# Altium schematic symbol library LATTICEPLDS_Library.SchLib: 291 symbols (part 17 of 32) (continued)
## LFE5G-25F-BG381 (continued)
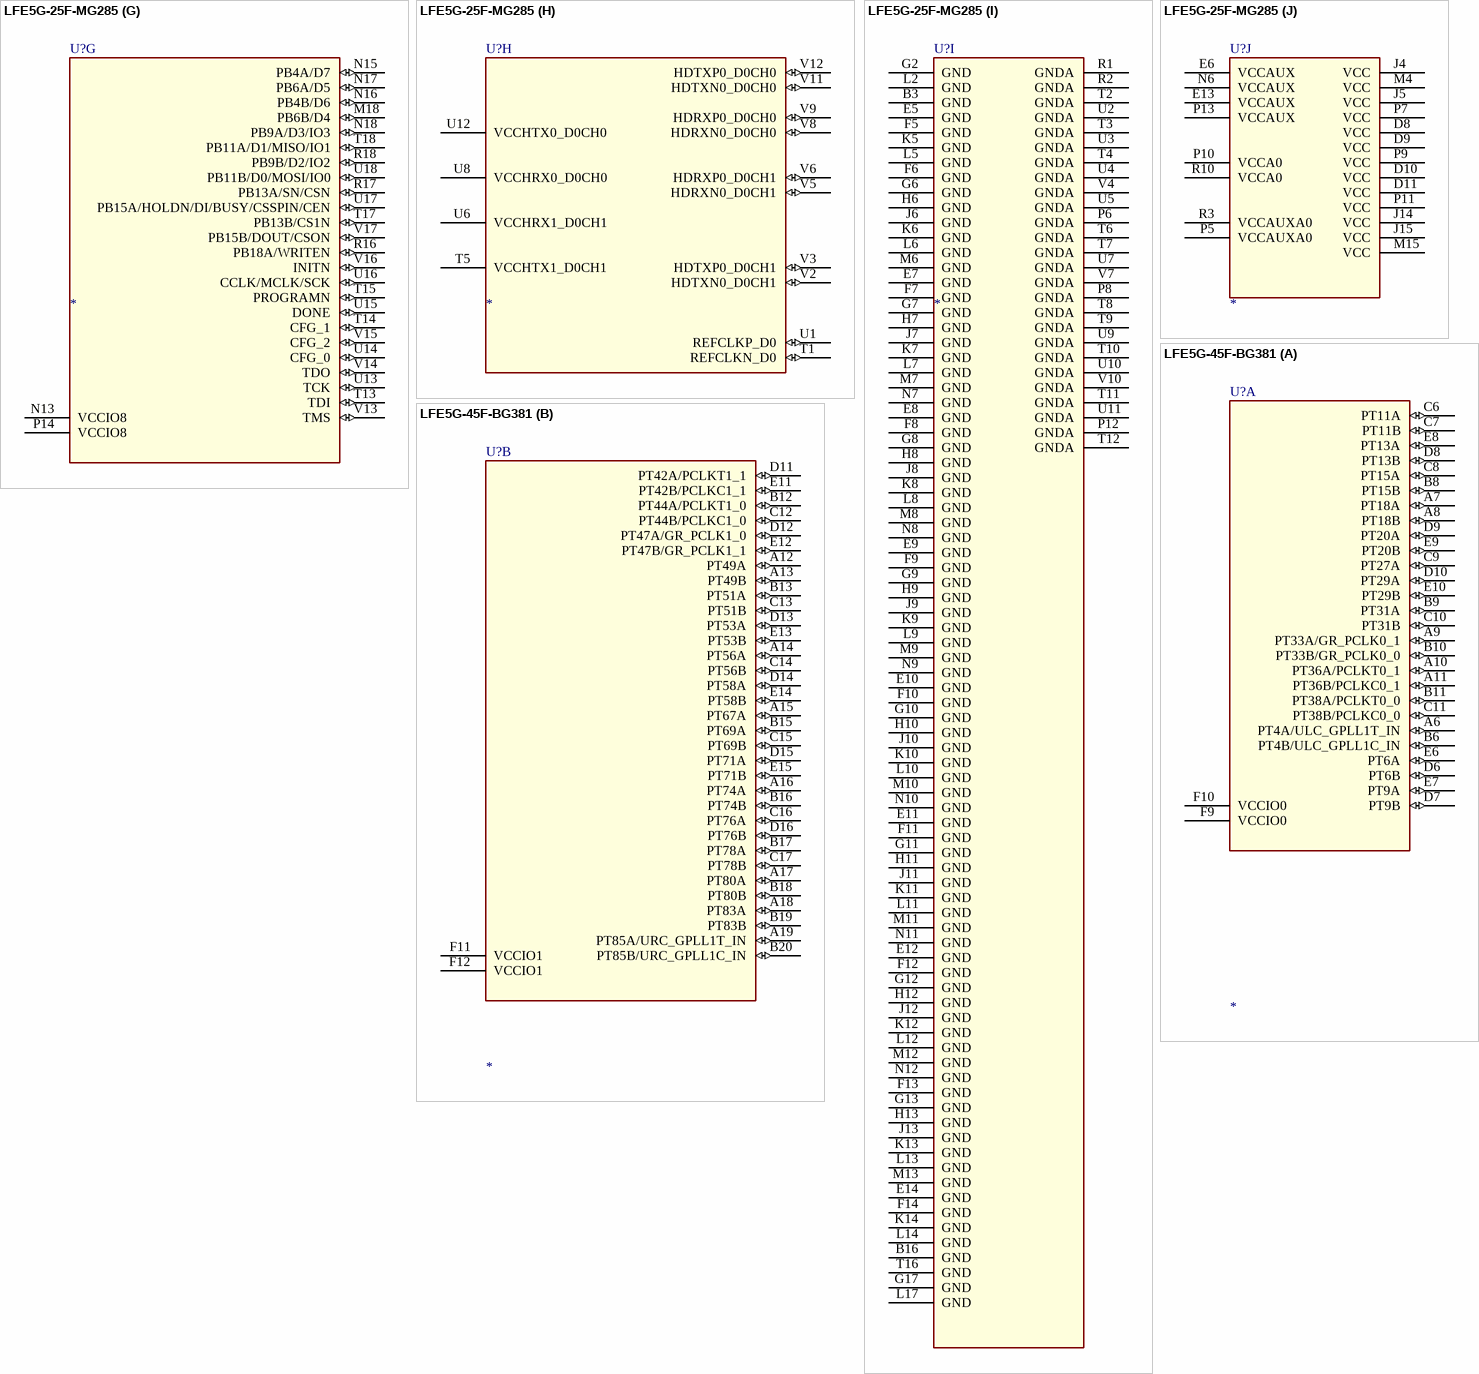
[diagram p158: symbols LFE5G-25F-MG285 to LFE5G-45F-BG381]

## LFE5G-25F-MG285
designator U?
SPLIT_INST: TRUE; SWAP_INFO: (S1+S2+S3+S4+S5+S6+S7+S8+S9+S10)
part A pins: A10 PT27B/PCLKC0_1 (io), A11 PT27A/PCLKT0_1 (io), B10 PT29A/PCLKT0_0 (io), B11 PT4A (io), C10 PT29B/PCLKC0_0 (io), C11 PT4B (io), D12 VCCIO0 (power)
part B pins: A8 PT35B/PCLKC1_0 (io), A9 PT35A/PCLKT1_0 (io), B8 PT67A (io), B9 PT33A/PCLKT1_1 (io), C8 PT67B (io), C9 PT33B/PCLKC1_1 (io), D7 VCCIO1 (power)
part C pins: A2 PR20C (io), A3 PR20A (io), A4 PR11B (io), A6 PR11A (io), A7 PR8B (io), B1 PR23B/PCLKC2_1 (io), B2 PR20B (io), B4 PR14C/VREF1_2 (io), B6 PR8A (io), B7 PR2B (io), C1 PR23C/PCLKT2_0 (io), C2 PR17B (io), C3 PR14D (io), C4 PR14B (io), C6 PR5B (io), C7 PR2A (io), D1 PR23D/PCLKC2_0 (io), D2 PR23A/PCLKT2_1 (io), D3 PR17A (io), D4 PR14A (io), D6 PR5A (io), G5 VCCIO2 (power), H5 VCCIO2 (power)
part D pins:  F15 PR26C/PCLKT3_0 (io),  F16 PR26D/PCLKC3_0 (io),  F17 PR32A (io),  F18 PR35C (io),  G15 PR26B/PCLKC3_1 (io),  G16 PR29B (io),  G18 PR32B (io),  H15 PR26A/PCLKT3_1 (io),  H16 PR29A (io),  H17 PR29D (io),  H18 PR35D (io),  J16 PR29C (io),  J17 PR35A (io),  J18 PR35B/VREF1_3 (io),  K15 PR38A (io),  K16 PR41C (io),  K17 PR44A (io),  K18 PR41D (io),  L15 PR38B (io),  L16 PR41B (io),  L18 PR44B (io),  M16 PR41A (io),  M17 PR44C (io),  M18 PR47C/LRC_GPLL0T_IN (io),  N15 PR38C (io),  N16 PR38D (io),  N17 PR44D (io),  N18 PR47D/LRC_GPLL0C_IN (io), M14 VCCIO3 (power), N14 VCCIO3 (power)
part E pins: C18 PL26B/PCLKC6_1 (io), D17 PL26A/PCLKT6_1 (io), D18 PL26C/PCLKT6_0 (io), F15 PL29C (io), F16 PL29B (io), F17 PL29A (io), F18 PL26D/PCLKC6_0 (io), G15 PL35A (io), G16 PL29D (io), G18 PL32A (io), H15 PL35B/VREF1_6 (io), H16 PL35C (io), H17 PL32B (io), H18 PL38D (io), J16 PL35D (io), J17 PL38C (io), J18 PL41A (io), K15 PL41D (io), K16 PL41C (io), K17 PL44A (io), K18 PL41B (io), L15 PL44C (io), L16 PL44D (io), L18 PL44B (io), M14 VCCIO6 (power), M16 PL47C/LLC_GPLL0T_IN (io), M17 PL47D/LLC_GPLL0C_IN (io), N14 VCCIO6 (power)
part F pins: A12 PL5A (io), A13 PL14B (io), A15 PL14D (io), A16 PL20B (io), A17 PL23A/PCLKT7_1 (io), B12 PL2B (io), B13 PL14A (io), B15 PL20A (io), B17 PL23B/PCLKC7_1 (io), B18 PL23C/PCLKT7_0 (io), C12 PL2A (io), C13 PL8B (io), C15 PL14C/VREF1_7 (io), C16 PL20C (io), C17 PL23D/PCLKC7_0 (io), D13 PL8A (io), D15 PL17A (io), D16 PL17B (io), G14 VCCIO7 (power), H14 VCCIO7 (power)
part G pins: M18 PB6B/D4 (io), N13 VCCIO8 (power), N15 PB4A/D7 (io), N16 PB4B/D6 (io), N17 PB6A/D5 (io), N18 PB9A/D3/IO3 (io), P14 VCCIO8 (power), R16 PB18A/WRITEN (io), R17 PB13A/SN/CSN (io), R18 PB9B/D2/IO2 (io), T13 TDI (io), T14 CFG_1 (io), T15 PROGRAMN (io), T17 PB13B/CS1N (io), T18 PB11A/D1/MISO/IO1 (io), U13 TCK (io), U14 CFG_0 (io), U15 DONE (io), U16 CCLK/MCLK/SCK (io), U17 PB15A/HOLDN/DI/BUSY/CSSPIN/CEN (io), U18 PB11B/D0/MOSI/IO0 (io), V13 TMS (io), V14 TDO (io), V15 CFG_2 (io), V16 INITN (io), V17 PB15B/DOUT/CSON (io)
part H pins: T1 REFCLKN_D0 (io), T5 VCCHTX1_D0CH1 (power), U1 REFCLKP_D0 (io), U6 VCCHRX1_D0CH1 (power), U8 VCCHRX0_D0CH0 (power), U12 VCCHTX0_D0CH0 (power), V2 HDTXN0_D0CH1 (io), V3 HDTXP0_D0CH1 (io), V5 HDRXN0_D0CH1 (io), V6 HDRXP0_D0CH1 (io), V8 HDRXN0_D0CH0 (io), V9 HDRXP0_D0CH0 (io), V11 HDTXN0_D0CH0 (io), V12 HDTXP0_D0CH0 (io)
part I pins: B3 GND (power), B16 GND (power), E5 GND (power), E7 GND (power), E8 GND (power), E9 GND (power), E10 GND (power), E11 GND (power), E12 GND (power), E14 GND (power), F5 GND (power), F6 GND (power), F7 GND (power), F8 GND (power), F9 GND (power), F10 GND (power), F11 GND (power), F12 GND (power), F13 GND (power), F14 GND (power), G2 GND (power), G6 GND (power), G7 GND (power), G8 GND (power), G9 GND (power), G10 GND (power), G11 GND (power), G12 GND (power), G13 GND (power), G17 GND (power), H6 GND (power), H7 GND (power), H8 GND (power), H9 GND (power), H10 GND (power), H11 GND (power), H12 GND (power), H13 GND (power), J6 GND (power), J7 GND (power), J8 GND (power), J9 GND (power), J10 GND (power), J11 GND (power), J12 GND (power), J13 GND (power), K5 GND (power), K6 GND (power), K7 GND (power), K8 GND (power), K9 GND (power), K10 GND (power), K11 GND (power), K12 GND (power), K13 GND (power), K14 GND (power), L2 GND (power), L5 GND (power), L6 GND (power), L7 GND (power), L8 GND (power), L9 GND (power), L10 GND (power), L11 GND (power), L12 GND (power), L13 GND (power), L14 GND (power), L17 GND (power), M6 GND (power), M7 GND (power), M8 GND (power), M9 GND (power), M10 GND (power), M11 GND (power), M12 GND (power), M13 GND (power), N7 GND (power), N8 GND (power), N9 GND (power), N10 GND (power), N11 GND (power), N12 GND (power), P6 GNDA (power), P8 GNDA (power), P12 GNDA (power), R1 GNDA (power), R2 GNDA (power), T2 GNDA (power), T3 GNDA (power), T4 GNDA (power), T6 GNDA (power), T7 GNDA (power), T8 GNDA (power), T9 GNDA (power), T10 GNDA (power), T11 GNDA (power), T12 GNDA (power), T16 GND (power), U2 GNDA (power), U3 GNDA (power), U4 GNDA (power), U5 GNDA (power), U7 GNDA (power), U9 GNDA (power), U10 GNDA (power), U11 GNDA (power), V4 GNDA (power), V7 GNDA (power), V10 GNDA (power)
part J pins: D8 VCC (power), D9 VCC (power), D10 VCC (power), D11 VCC (power), E6 VCCAUX (power), E13 VCCAUX (power), J4 VCC (power), J5 VCC (power), J14 VCC (power), J15 VCC (power), M4 VCC (power), M15 VCC (power), N6 VCCAUX (power), P5 VCCAUXA0 (power), P7 VCC (power), P9 VCC (power), P10 VCCA0 (power), P11 VCC (power), P13 VCCAUX (power), R3 VCCAUXA0 (power), R10 VCCA0 (power)

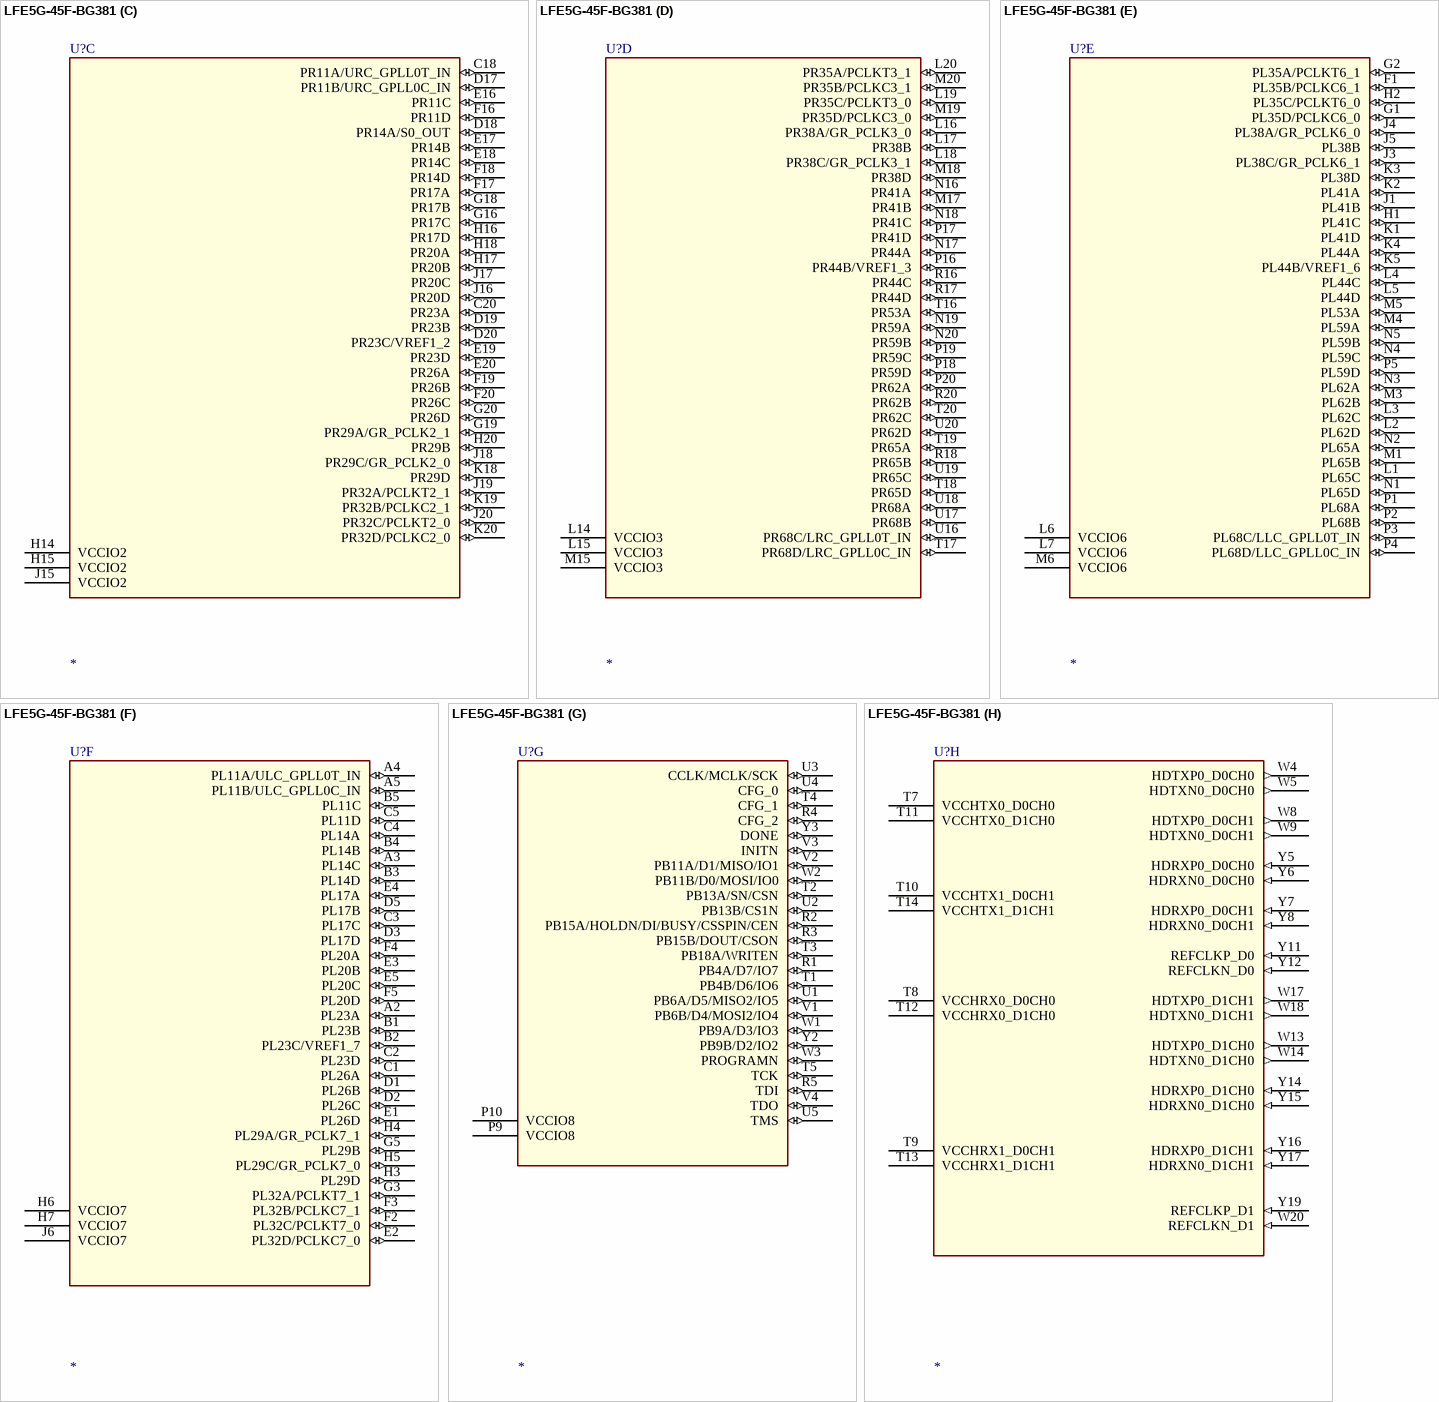
[diagram p159: symbol LFE5G-45F-BG381]

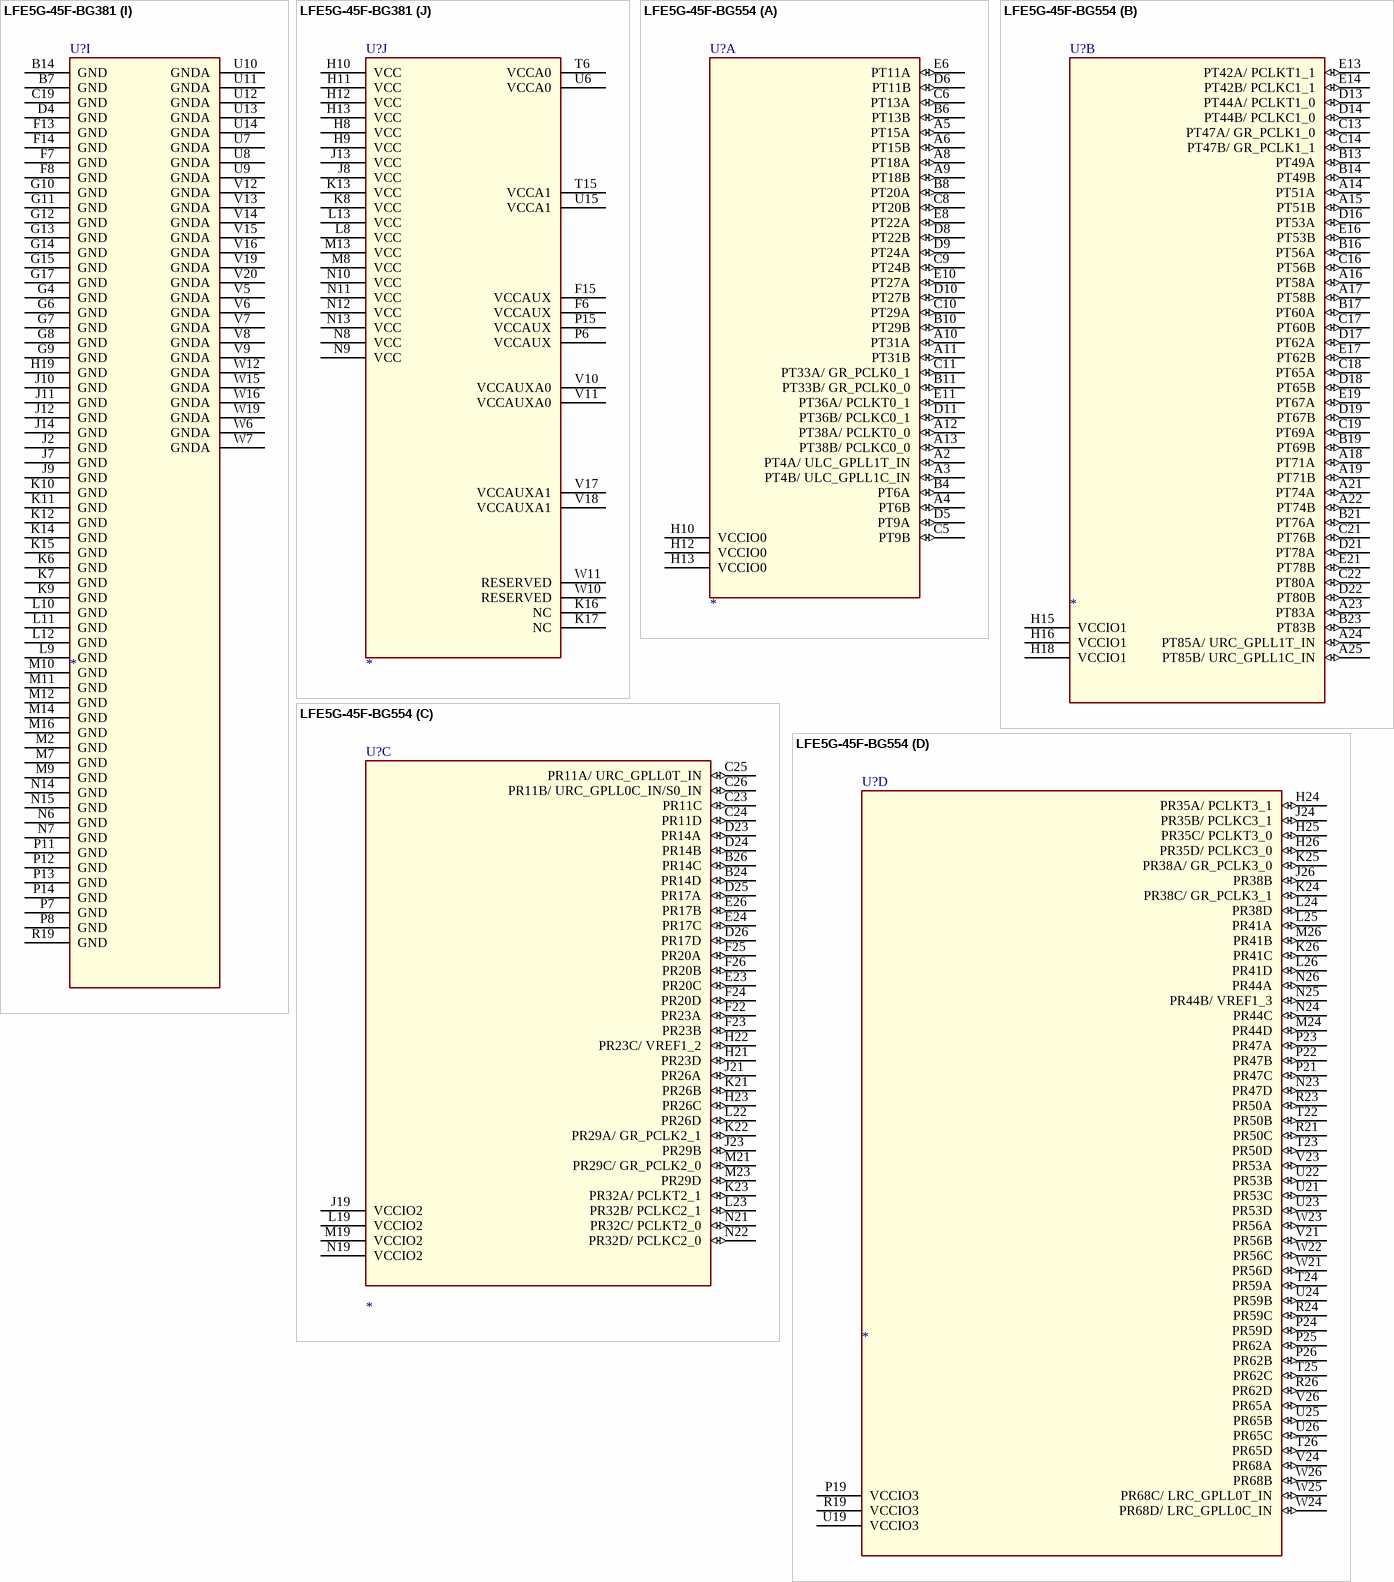
[diagram p160: symbols LFE5G-45F-BG381 to LFE5G-45F-BG554]

## LFE5G-45F-BG381
designator U?
SWAP_INFO: (S1+S2+S3+S4+S5+S6+S7+S8+S9+S10); SPLIT_INST: TRUE
part A pins: A6 PT4A/ULC_GPLL1T_IN (io), A7 PT18A (io), A8 PT18B (io), A9 PT33A/GR_PCLK0_1 (io), A10 PT36A/PCLKT0_1 (io), A11 PT36B/PCLKC0_1 (io), B6 PT4B/ULC_GPLL1C_IN (io), B8 PT15B (io), B9 PT31A (io), B10 PT33B/GR_PCLK0_0 (io), B11 PT38A/PCLKT0_0 (io), C6 PT11A (io), C7 PT11B (io), C8 PT15A (io), C9 PT27A (io), C10 PT31B (io), C11 PT38B/PCLKC0_0 (io), D6 PT6B (io), D7 PT9B (io), D8 PT13B (io), D9 PT20A (io), D10 PT29A (io), E6 PT6A (io), E7 PT9A (io), E8 PT13A (io), E9 PT20B (io), E10 PT29B (io), F9 VCCIO0 (power), F10 VCCIO0 (power)
part B pins: A12 PT49A (io), A13 PT49B (io), A14 PT56A (io), A15 PT67A (io), A16 PT74A (io), A17 PT80A (io), A18 PT83A (io), A19 PT85A/URC_GPLL1T_IN (io), B12 PT44A/PCLKT1_0 (io), B13 PT51A (io), B15 PT69A (io), B16 PT74B (io), B17 PT78A (io), B18 PT80B (io), B19 PT83B (io), B20 PT85B/URC_GPLL1C_IN (io), C12 PT44B/PCLKC1_0 (io), C13 PT51B (io), C14 PT56B (io), C15 PT69B (io), C16 PT76A (io), C17 PT78B (io), D11 PT42A/PCLKT1_1 (io), D12 PT47A/GR_PCLK1_0 (io), D13 PT53A (io), D14 PT58A (io), D15 PT71A (io), D16 PT76B (io), E11 PT42B/PCLKC1_1 (io), E12 PT47B/GR_PCLK1_1 (io), E13 PT53B (io), E14 PT58B (io), E15 PT71B (io), F11 VCCIO1 (power), F12 VCCIO1 (power)
part C pins: C18 PR11A/URC_GPLL0T_IN (io), C20 PR23A (io), D17 PR11B/URC_GPLL0C_IN (io), D18 PR14A/S0_OUT (io), D19 PR23B (io), D20 PR23C/VREF1_2 (io), E16 PR11C (io), E17 PR14B (io), E18 PR14C (io), E19 PR23D (io), E20 PR26A (io), F16 PR11D (io), F17 PR17A (io), F18 PR14D (io), F19 PR26B (io), F20 PR26C (io), G16 PR17C (io), G18 PR17B (io), G19 PR29A/GR_PCLK2_1 (io), G20 PR26D (io), H14 VCCIO2 (power), H15 VCCIO2 (power), H16 PR17D (io), H17 PR20B (io), H18 PR20A (io), H20 PR29B (io), J15 VCCIO2 (power), J16 PR20D (io), J17 PR20C (io), J18 PR29C/GR_PCLK2_0 (io), J19 PR32A/PCLKT2_1 (io), J20 PR32C/PCLKT2_0 (io), K18 PR29D (io), K19 PR32B/PCLKC2_1 (io), K20 PR32D/PCLKC2_0 (io)
part D pins: L14 VCCIO3 (power), L15 VCCIO3 (power), L16 PR38A/GR_PCLK3_0 (io), L17 PR38B (io), L18 PR38C/GR_PCLK3_1 (io), L19 PR35C/PCLKT3_0 (io), L20 PR35A/PCLKT3_1 (io), M15 VCCIO3 (power), M17 PR41B (io), M18 PR38D (io), M19 PR35D/PCLKC3_0 (io), M20 PR35B/PCLKC3_1 (io), N16 PR41A (io), N17 PR44A (io), N18 PR41C (io), N19 PR59A (io), N20 PR59B (io), P16 PR44B/VREF1_3 (io), P17 PR41D (io), P18 PR59D (io), P19 PR59C (io), P20 PR62A (io), R16 PR44C (io), R17 PR44D (io), R18 PR65B (io), R20 PR62B (io), T16 PR53A (io), T17 PR68D/LRC_GPLL0C_IN (io), T18 PR65D (io), T19 PR65A (io), T20 PR62C (io), U16 PR68C/LRC_GPLL0T_IN (io), U17 PR68B (io), U18 PR68A (io), U19 PR65C (io), U20 PR62D (io)
part E pins: F1 PL35B/PCLKC6_1 (io), G1 PL35D/PCLKC6_0 (io), G2 PL35A/PCLKT6_1 (io), H1 PL41C (io), H2 PL35C/PCLKT6_0 (io), J1 PL41B (io), J3 PL38C/GR_PCLK6_1 (io), J4 PL38A/GR_PCLK6_0 (io), J5 PL38B (io), K1 PL41D (io), K2 PL41A (io), K3 PL38D (io), K4 PL44A (io), K5 PL44B/VREF1_6 (io), L1 PL65C (io), L2 PL62D (io), L3 PL62C (io), L4 PL44C (io), L5 PL44D (io), L6 VCCIO6 (power), L7 VCCIO6 (power), M1 PL65B (io), M3 PL62B (io), M4 PL59A (io), M5 PL53A (io), M6 VCCIO6 (power), N1 PL65D (io), N2 PL65A (io), N3 PL62A (io), N4 PL59C (io), N5 PL59B (io), P1 PL68A (io), P2 PL68B (io), P3 PL68C/LLC_GPLL0T_IN (io), P4 PL68D/LLC_GPLL0C_IN (io), P5 PL59D (io)
part F pins: A2 PL23A (io), A3 PL14C (io), A4 PL11A/ULC_GPLL0T_IN (io), A5 PL11B/ULC_GPLL0C_IN (io), B1 PL23B (io), B2 PL23C/VREF1_7 (io), B3 PL14D (io), B4 PL14B (io), B5 PL11C (io), C1 PL26A (io), C2 PL23D (io), C3 PL17C (io), C4 PL14A (io), C5 PL11D (io), D1 PL26B (io), D2 PL26C (io), D3 PL17D (io), D5 PL17B (io), E1 PL26D (io), E2 PL32D/PCLKC7_0 (io), E3 PL20B (io), E4 PL17A (io), E5 PL20C (io), F2 PL32C/PCLKT7_0 (io), F3 PL32B/PCLKC7_1 (io), F4 PL20A (io), F5 PL20D (io), G3 PL32A/PCLKT7_1 (io), G5 PL29B (io), H3 PL29D (io), H4 PL29A/GR_PCLK7_1 (io), H5 PL29C/GR_PCLK7_0 (io), H6 VCCIO7 (power), H7 VCCIO7 (power), J6 VCCIO7 (power)
part G pins: P9 VCCIO8 (power), P10 VCCIO8 (power), R1 PB4A/D7/IO7 (io), R2 PB15A/HOLDN/DI/BUSY/CSSPIN/CEN (io), R3 PB15B/DOUT/CSON (io), R4 CFG_2 (io), R5 TDI (io), T1 PB4B/D6/IO6 (io), T2 PB13A/SN/CSN (io), T3 PB18A/WRITEN (io), T4 CFG_1 (io), T5 TCK (io), U1 PB6A/D5/MISO2/IO5 (io), U2 PB13B/CS1N (io), U3 CCLK/MCLK/SCK (io), U4 CFG_0 (io), U5 TMS (io), V1 PB6B/D4/MOSI2/IO4 (io), V2 PB11A/D1/MISO/IO1 (io), V3 INITN (io), V4 TDO (io), W1 PB9A/D3/IO3 (io), W2 PB11B/D0/MOSI/IO0 (io), W3 PROGRAMN (io), Y2 PB9B/D2/IO2 (io), Y3 DONE (io)
part H pins: T7 VCCHTX0_D0CH0 (power), T8 VCCHRX0_D0CH0 (power), T9 VCCHRX1_D0CH1 (power), T10 VCCHTX1_D0CH1 (power), T11 VCCHTX0_D1CH0 (power), T12 VCCHRX0_D1CH0 (power), T13 VCCHRX1_D1CH1 (power), T14 VCCHTX1_D1CH1 (power), W4 HDTXP0_D0CH0 (out), W5 HDTXN0_D0CH0 (out), W8 HDTXP0_D0CH1 (out), W9 HDTXN0_D0CH1 (out), W13 HDTXP0_D1CH0 (out), W14 HDTXN0_D1CH0 (out), W17 HDTXP0_D1CH1 (out), W18 HDTXN0_D1CH1 (out), W20 REFCLKN_D1 (in), Y5 HDRXP0_D0CH0 (in), Y6 HDRXN0_D0CH0 (in), Y7 HDRXP0_D0CH1 (in), Y8 HDRXN0_D0CH1 (in), Y11 REFCLKP_D0 (in), Y12 REFCLKN_D0 (in), Y14 HDRXP0_D1CH0 (in), Y15 HDRXN0_D1CH0 (in), Y16 HDRXP0_D1CH1 (in), Y17 HDRXN0_D1CH1 (in), Y19 REFCLKP_D1 (in)
part I pins: B7 GND (power), B14 GND (power), C19 GND (power), D4 GND (power), F7 GND (power), F8 GND (power), F13 GND (power), F14 GND (power), G4 GND (power), G6 GND (power), G7 GND (power), G8 GND (power), G9 GND (power), G10 GND (power), G11 GND (power), G12 GND (power), G13 GND (power), G14 GND (power), G15 GND (power), G17 GND (power), H19 GND (power), J2 GND (power), J7 GND (power), J9 GND (power), J10 GND (power), J11 GND (power), J12 GND (power), J14 GND (power), K6 GND (power), K7 GND (power), K9 GND (power), K10 GND (power), K11 GND (power), K12 GND (power), K14 GND (power), K15 GND (power), L9 GND (power), L10 GND (power), L11 GND (power), L12 GND (power), M2 GND (power), M7 GND (power), M9 GND (power), M10 GND (power), M11 GND (power), M12 GND (power), M14 GND (power), M16 GND (power), N6 GND (power), N7 GND (power), N14 GND (power), N15 GND (power), P7 GND (power), P8 GND (power), P11 GND (power), P12 GND (power), P13 GND (power), P14 GND (power), R19 GND (power), U7 GNDA (power), U8 GNDA (power), U9 GNDA (power), U10 GNDA (power), U11 GNDA (power), U12 GNDA (power), U13 GNDA (power), U14 GNDA (power), V5 GNDA (power), V6 GNDA (power), V7 GNDA (power), V8 GNDA (power), V9 GNDA (power), V12 GNDA (power), V13 GNDA (power), V14 GNDA (power), V15 GNDA (power), V16 GNDA (power), V19 GNDA (power), V20 GNDA (power), W6 GNDA (power), W7 GNDA (power), W12 GNDA (power), W15 GNDA (power), W16 GNDA (power), W19 GNDA (power)
part J pins: F6 VCCAUX (power), F15 VCCAUX (power), H8 VCC (power), H9 VCC (power), H10 VCC (power), H11 VCC (power), H12 VCC (power), H13 VCC (power), J8 VCC (power), J13 VCC (power), K8 VCC (power), K13 VCC (power), K16 NC (power), K17 NC (power), L8 VCC (power), L13 VCC (power), M8 VCC (power), M13 VCC (power), N8 VCC (power), N9 VCC (power), N10 VCC (power), N11 VCC (power), N12 VCC (power), N13 VCC (power), P6 VCCAUX (power), P15 VCCAUX (power), T6 VCCA0 (power), T15 VCCA1 (power), U6 VCCA0 (power), U15 VCCA1 (power), V10 VCCAUXA0 (power), V11 VCCAUXA0 (power), V17 VCCAUXA1 (power), V18 VCCAUXA1 (power), W10 RESERVED (power), W11 RESERVED (power)

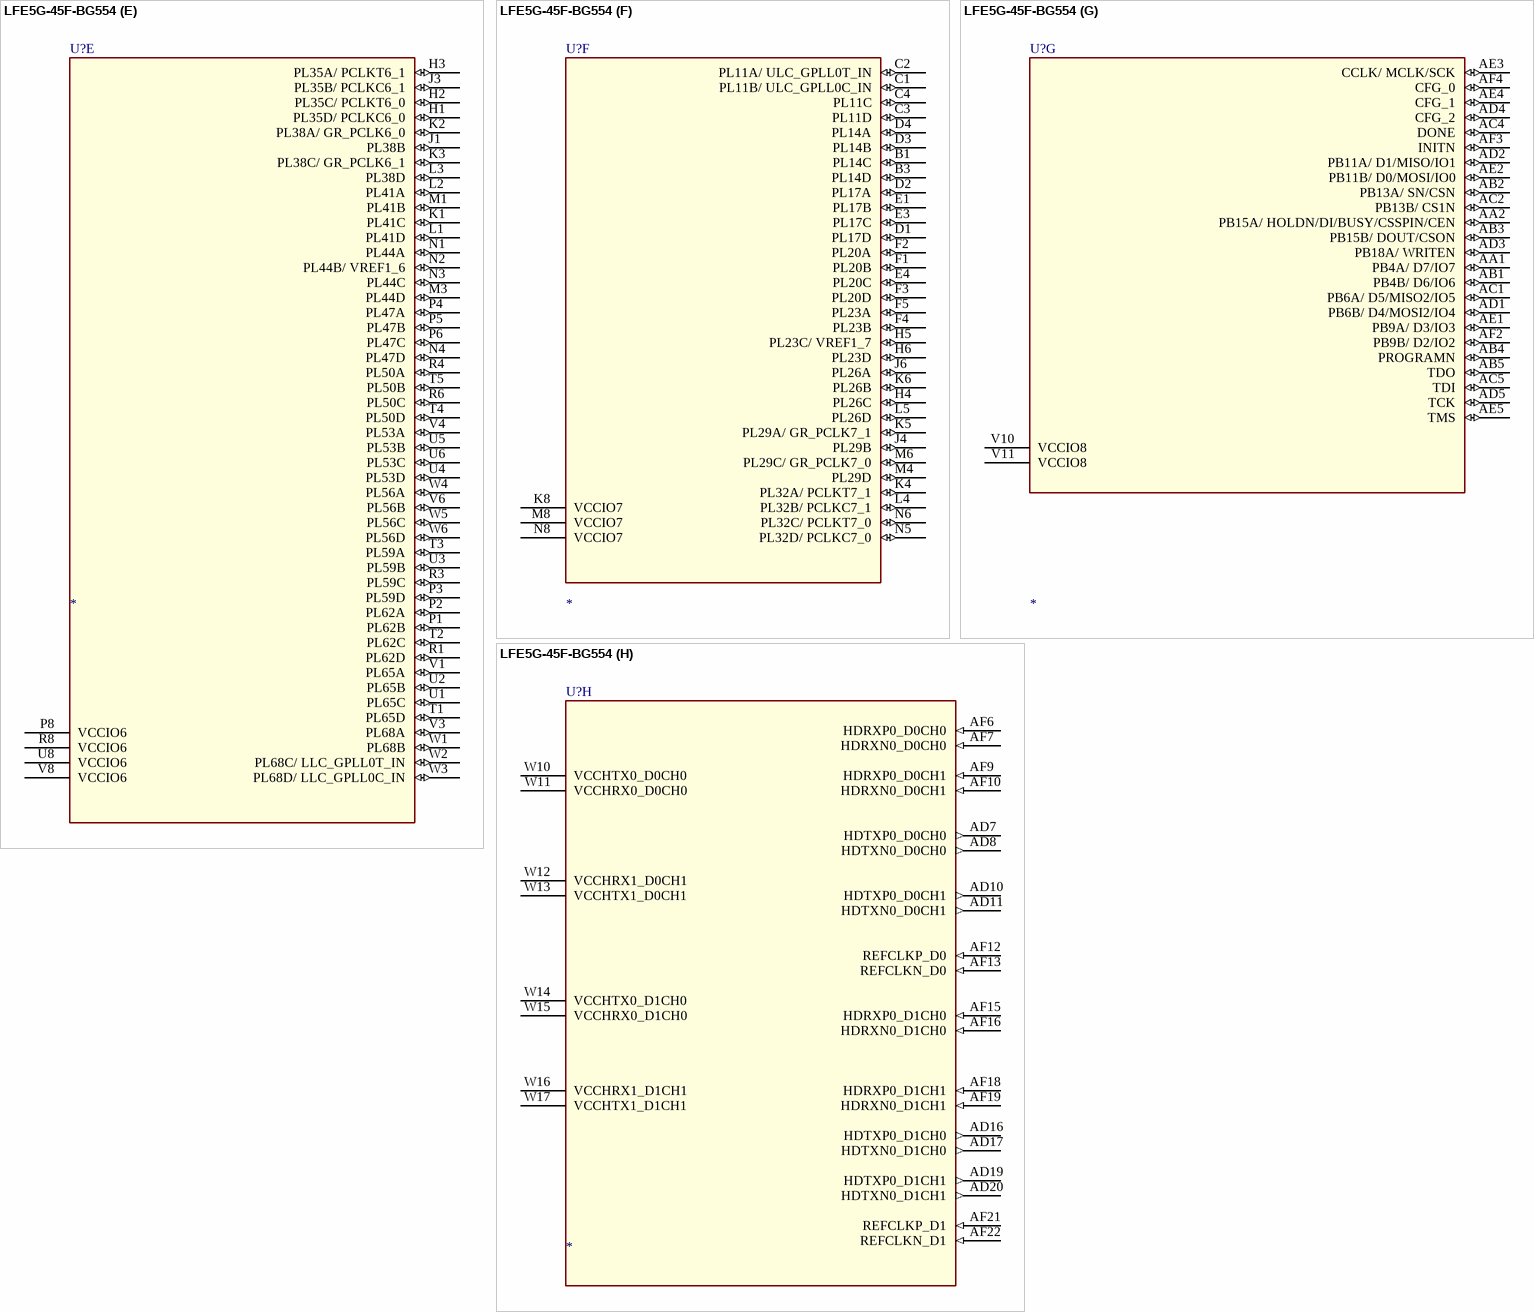
[diagram p161: symbol LFE5G-45F-BG554]
